# Altium footprint library std-th.PcbLib: 245 footprints (part 4 of 16)
Each footprint in its own frame and in the unit in brackets; x right, y up, seen from the top. Pads: shape width x height; smd on the part's side, far side on the other; paste and mask are expansions set on the pad; w line width, h text height; cw(c..) or ccw(c..) is an arc to the next point about the centre after c.
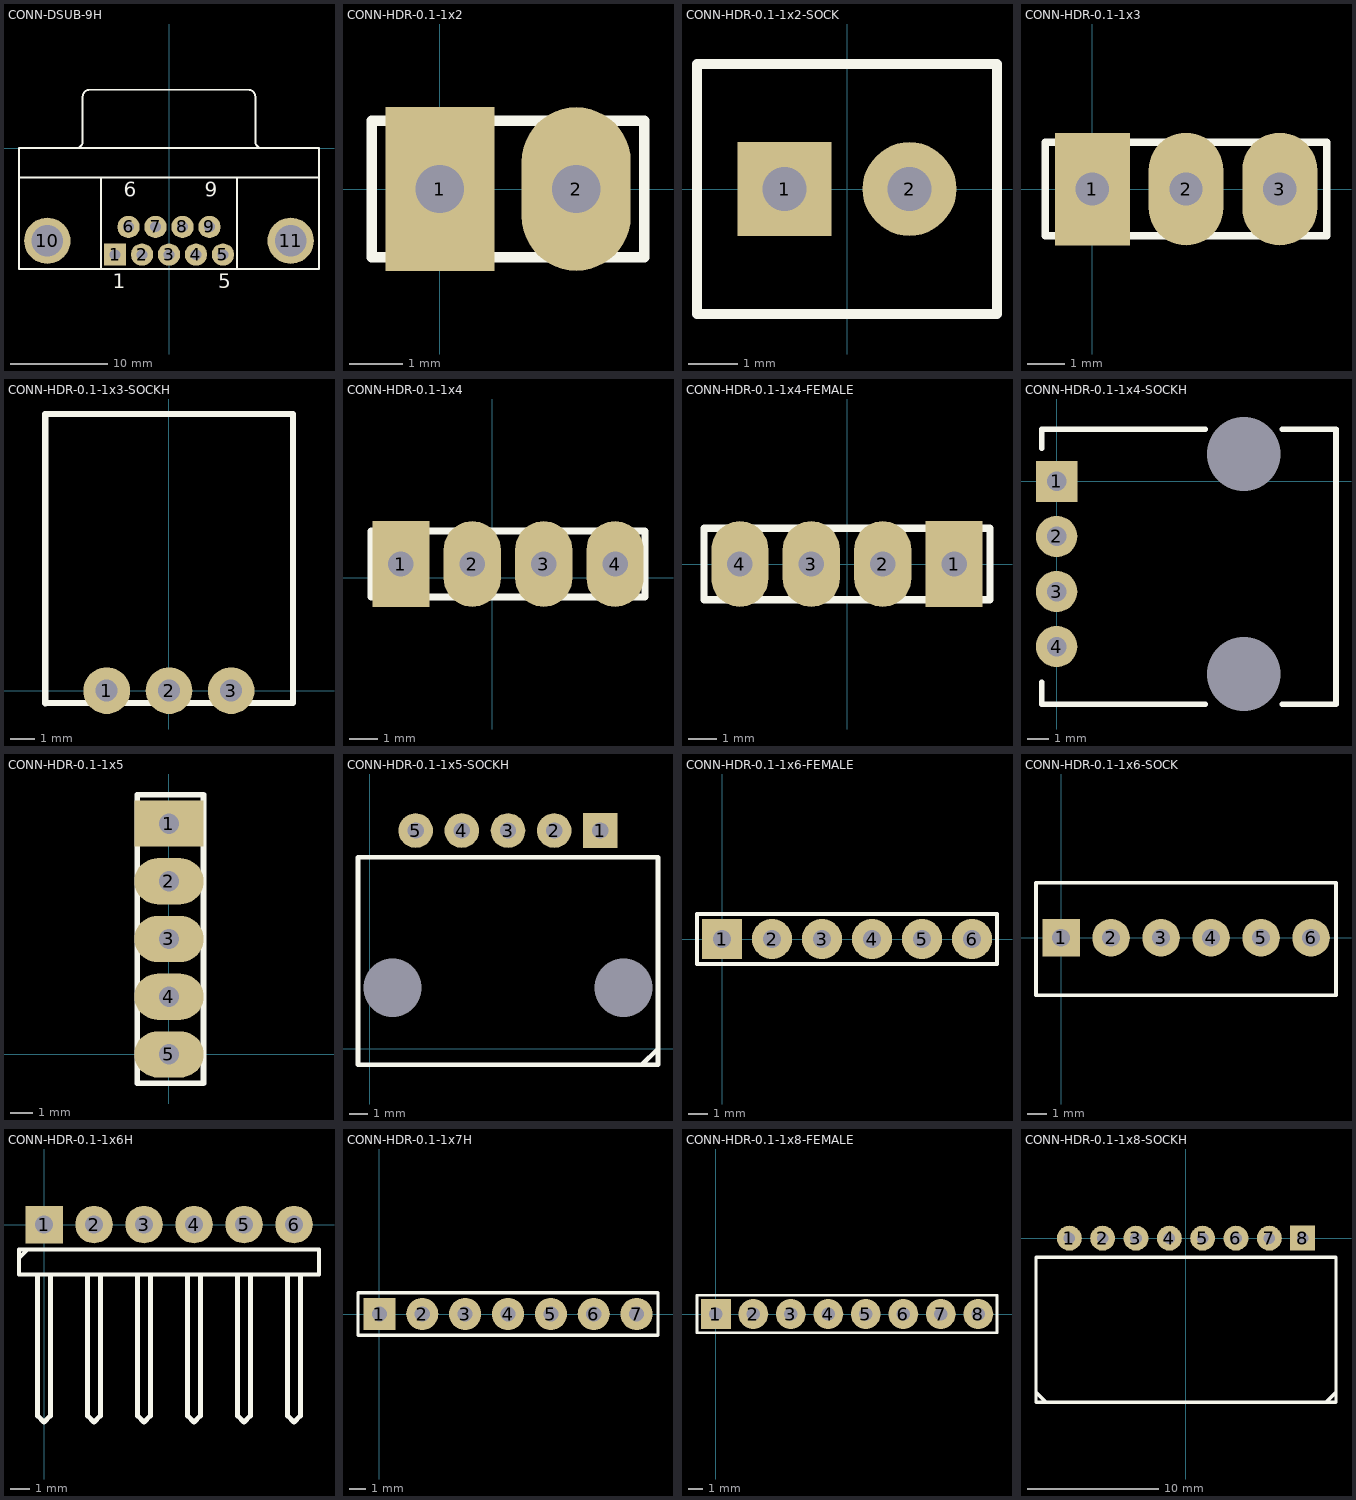
[diagram p3: the footprints below, top view; thin cyan lines are the x and y axes]

## CONN-DSUB-9H [mm] "Connector; D Subminiature; 9 Position; Right Angle; Pitch 1.385 mm"
height 12.75
pads (11):
  rect 2.286x2.286 hole 1.09: 1(-5.54,-10.92)
  round 2.286 hole 1.09: 2(-2.77,-10.92) 3(0,-10.92) 4(2.77,-10.92) 5(5.54,-10.92) 6(-4.155,-8.08) 7(-1.385,-8.08) 8(1.385,-8.08) 9(4.155,-8.08)
  round 4.76 hole 3.26: 10(-12.495,-9.5) 11(12.495,-9.5)
Top Overlay:
  lines w0.2: -15.4,-3 15.4,-3 ; -9.56,0.005 ccw(c-9.56,0.7) -8.865,0.7 -8.865,5.3 ; -8.86,5.305 cw(c-8.165,5.305) -8.165,6 8.165,6 cw(c8.165,5.305) 8.86,5.305 ; -7,-12.4 -7,-3 ; 7,-12.4 7,-3 ; 8.865,5.3 8.865,0.7 ccw(c9.56,0.7) 9.56,0.005 ; -15.4,-12.4 -15.4,0 15.4,0 15.4,-12.4 -15.4,-12.4
  text "1" at -5.79,-14.375 h1.5
  text "5" at 5.04,-14.375 h1.5
  text "9" at 3.655,-4.975 h1.5
  text "6" at -4.655,-4.975 h1.5
3D body: height 12.5, standoff -4.1, extent -15.618,-12.7 15.618,7.9

## CONN-HDR-0.1-1x2 [mil] "Header, 100 mil pitch, 2 way single row"
height 78.74
pads (2):
  rect 80x120 hole 35.43: 1(0,0)
  oval 80x120 hole 35.43: 2(100,0)
Top Overlay:
  lines w7.87: -50,-50 150,-50 150,50 -50,50 -50,-50
3D body: height 332.28, standoff -100, extent -49.99,-49.99 150.01,50.01

## CONN-HDR-0.1-1x2-SOCK [mm] "Header, socket, 1 row 2 way"
height 8
pads (2):
  rect 1.905x1.905 hole 0.9: 1(-1.27,0)
  round 1.905 hole 0.9: 2(1.27,0)
Top Overlay:
  lines w0.203: -3.048,-2.54 3.048,-2.54 3.048,2.54 -3.048,2.54 -3.048,-2.54
3D body: height 6.26, standoff -4.56, extent -3,-2.5 3,2.5

## CONN-HDR-0.1-1x3 [mil] "Connector; Header; 3 Position"
height 250
pads (3):
  rect 80x120 hole 35.43: 1(0,0)
  oval 80x120 hole 35.43: 2(100,0) 3(200,0)
Top Overlay:
  lines w7.87: -50,-50 -50,50 250,50 250,-50 -50,-50
3D body: height 335.85, standoff -144.88, extent -49.99,-57.47 250.01,57.49

## CONN-HDR-0.1-1x3-SOCKH [mm] "Header, 3 way, 100 mil pitch, horizontal socket"
height 5
pads (3):
  round 1.905 hole 0.9: 1(-2.54,0) 2(0.005,0) 3(2.54,0)
Top Overlay:
  lines w0.254: -5.055,-0.508 5.06,-0.508 5.06,11.295 -5.05,11.295 -5.05,-0.515
3D body: height 6.39, standoff -3.75, extent -5.045,-0.515 5.065,11.295

## CONN-HDR-0.1-1x4 [mil] "Header, 4 way, 100 mil pitch"
height 393.7
pads (4):
  rect 80x120 hole 35.43: 1(-128,19)
  oval 80x120 hole 35.43: 2(-28,19) 3(72,19) 4(172,19)
Top Overlay:
  lines w10: -169.99,-26.99 214.01,-26.99 214.01,65.01 -169.99,65.01 -169.99,-26.99
3D body: height 320, standoff -107, extent -169.99,-26.99 214.01,65.01

## CONN-HDR-0.1-1x4-FEMALE [mil] "Header, receptable, 4 way, 100 mil pitch"
height 314.96
pads (4):
  rect 80x120 hole 35.43: 1(150,0)
  oval 80x120 hole 35.43: 2(50,0) 3(-50,0) 4(-150,0)
Top Overlay:
  lines w10: -199.99,-49.99 200.01,-49.99 200.01,50.01 -199.99,50.01 -199.99,-49.99
3D body: height 237.01, standoff -122.05, extent -199.99,-49.99 200.01,50.01

## CONN-HDR-0.1-1x4-SOCKH [mm] "Header, socket, 1 row 4 way, right angle"
pads (6):
  rrect50% 0x0 hole 3.4 unplated: 0(8.636,-8.89) 0(8.636,1.27)
  rect 1.905x1.905 hole 0.9: 1(0,0)
  round 1.905 hole 0.9: 2(0,-2.54) 3(0,-5.08) 4(0,-7.62)
Top Overlay:
  lines w0.254: -0.698,-9.271 -0.698,-10.287 6.858,-10.287 ; -0.698,1.524 -0.698,2.413 6.858,2.413 ; 10.414,-10.287 12.891,-10.287 12.89,2.413 10.414,2.413 ; 6.858,-10.287 6.858,-10.287
3D body: height 6.98, standoff -3.3, extent -0.698,-10.287 12.891,2.413

## CONN-HDR-0.1-1x5 [mil] "Header, 100 mil pitch, 5 way"
height 393.7
pads (5):
  rect 120x80 hole 35.43: 1(0,400)
  oval 120x80 hole 35.43: 2(0,300) 3(0,200) 4(0,100) 5(0,0)
Top Overlay:
  lines w10: -55.12,-49.99 -55.12,450.01 59.85,450.01 59.85,-49.99 -55.12,-49.99
3D body: height 335.04, standoff -144.88, extent -55.12,-49.99 59.85,450.01

## CONN-HDR-0.1-1x5-SOCKH [mm] "Header, Socket, 5 way, 100 mil pitch, right angle"
height 6
pads (7):
  round 0 hole 3.2: 0(1.27,3.351) 0(13.97,3.351)
  rect 1.905x1.905 hole 0.9: 1(12.7,12.001)
  round 1.905 hole 0.9: 2(10.16,12.001) 3(7.62,12.001) 4(5.08,12.001) 5(2.54,12.001)
Top Overlay:
  lines w0.254: 14.986,-0.889 15.874,-0.001 15.874,0 ; 15.874,-0.889 15.874,10.541 -0.635,10.541 -0.634,10.539 -0.634,-0.889 15.874,-0.889 ; 15.874,-0.889 15.874,-0.889
3D body: height 6.98, standoff -3.81, extent -0.634,-0.889 15.874,12.7

## CONN-HDR-0.1-1x6-FEMALE [mil] "Female header, 100 mil pitch, 6 way single row"
height 393.7
pads (6):
  rect 80x80 hole 35.43: 1(0,0)
  round 80 hole 35.43: 2(100,0) 3(200,0) 4(300,0) 5(400,0) 6(500,0)
Top Overlay:
  lines w7.87: -50,-50 550,-50 550,50 -50,50 -50,-50
3D body: height 334.65, standoff -411.79, extent -49.99,-49.99 550.01,50.01

## CONN-HDR-0.1-1x6-SOCK [mm] "Connector; Header; 6 Position"
height 6.35
pads (6):
  rect 1.905x1.905 hole 0.9: 1(0,0)
  round 1.905 hole 0.9: 2(2.54,0) 3(5.08,0) 4(7.62,0) 5(10.16,0) 6(12.7,0)
Top Overlay:
  lines w0.2: -1.27,-2.921 13.97,-2.921 13.97,2.794 -1.27,2.794 -1.27,-2.921
3D body: height 11.8, standoff -3.44, extent -1.27,-2.972 13.97,2.87

## CONN-HDR-0.1-1x6H [mm] "Connector; Header; 6 Position; Right Angle"
height 2
pads (6):
  rect 1.905x1.905 hole 0.9: 1(0,0)
  round 1.905 hole 0.9: 2(2.54,0) 3(5.08,0) 4(7.62,0) 5(10.16,0) 6(12.7,0)
Top Overlay:
  lines w0.2: -1.27,-1.693 -0.847,-1.27 ; -1.27,-2.54 13.97,-2.54 13.97,-1.27 -1.27,-1.27 -1.27,-2.54
  lines w0.254: -0.32,-2.606 -0.32,-9.64 -0.32,-9.719 0,-10.04 0.32,-9.72 0.32,-9.64 0.32,-2.606 ; 2.22,-2.606 2.22,-9.641 2.22,-9.72 2.54,-10.04 2.86,-9.72 2.86,-9.641 2.86,-2.606 ; 4.76,-2.606 4.76,-9.64 4.76,-9.719 5.08,-10.04 5.4,-9.72 5.4,-9.64 5.4,-2.606 ; 7.3,-2.606 7.3,-9.64 7.3,-9.719 7.62,-10.04 7.94,-9.72 7.94,-9.64 7.94,-2.606 ; 9.84,-2.606 9.84,-9.64 9.84,-9.719 10.16,-10.04 10.48,-9.72 10.48,-9.64 10.48,-2.606 ; 12.38,-2.607 12.38,-9.641 12.38,-9.72 12.7,-10.041 13.02,-9.721 13.02,-9.641 13.02,-2.607
3D body: height 2.54, standoff -3, extent 11.43,-10.04 13.97,0.32
3D body: height 2.54, standoff -3, extent 8.89,-10.04 11.43,0.32
3D body: height 2.54, standoff -3, extent 6.35,-10.04 8.89,0.32
3D body: height 2.54, standoff -3, extent 3.81,-10.04 6.35,0.32
3D body: height 2.54, standoff -3, extent 1.27,-10.04 3.81,0.32
3D body: height 2.54, standoff -3, extent -1.27,-10.04 1.27,0.32

## CONN-HDR-0.1-1x7H [mm] "Connector; Header; 7 Position"
height 1
pads (7):
  rect 1.905x1.905 hole 0.9: 1(0,0)
  round 1.905 hole 0.9: 2(2.54,0) 3(5.08,0) 4(7.62,0) 5(10.16,0) 6(12.7,0) 7(15.24,0)
Top Overlay:
  lines w0.2: -1.27,-1.27 16.51,-1.27 16.51,1.27 -1.27,1.27 -1.27,-1.27
3D body: height 2.51, standoff -3, extent -1.27,-0.32 16.51,9.81

## CONN-HDR-0.1-1x8-FEMALE [mil] "Female header, 100 mil pitch, 8 way single row"
height 78.74
pads (8):
  rect 80x80 hole 35.43: 1(0,0)
  round 80 hole 35.43: 2(100,0) 3(200,0) 4(300,0) 5(400,0) 6(500,0) 7(600,0) 8(700,0)
Top Overlay:
  lines w7.87: -50,-50 -50,50 750,50 750,-50 -50,-50
3D body: height 334.65, standoff -411.79, extent -49.99,-49.99 750.01,50.01

## CONN-HDR-0.1-1x8-SOCKH [mm] "Header, Socket, 8 way, 100 mil pitch, right angle"
height 6
pads (8):
  round 1.905 hole 0.9 unplated: 1(-8.89,0) 2(-6.35,0) 3(-3.81,0)
  round 1.905 hole 0.9: 4(-1.27,0) 5(1.27,0) 6(3.81,0) 7(6.35,0)
  rect 1.905x1.905 hole 0.9: 8(8.89,0)
Top Overlay:
  lines w0.254: -11.43,-11.747 -10.668,-12.509 ; 10.668,-12.509 11.43,-11.747 ; -11.43,-12.509 11.43,-12.509 11.43,-1.46 -11.43,-1.46 -11.43,-12.509
3D body: height 6.98, standoff -3.3, extent -11.43,-12.573 11.43,1.016